# Altium footprint library Metric_Thru_Hole.PcbLib: 91 footprints (part 5 of 6)
Each footprint in its own frame and in the unit in brackets; x right, y up, seen from the top. Pads: shape width x height; smd on the part's side, far side on the other; paste and mask are expansions set on the pad; w line width, h text height; cw(c..) or ccw(c..) is an arc to the next point about the centre after c.
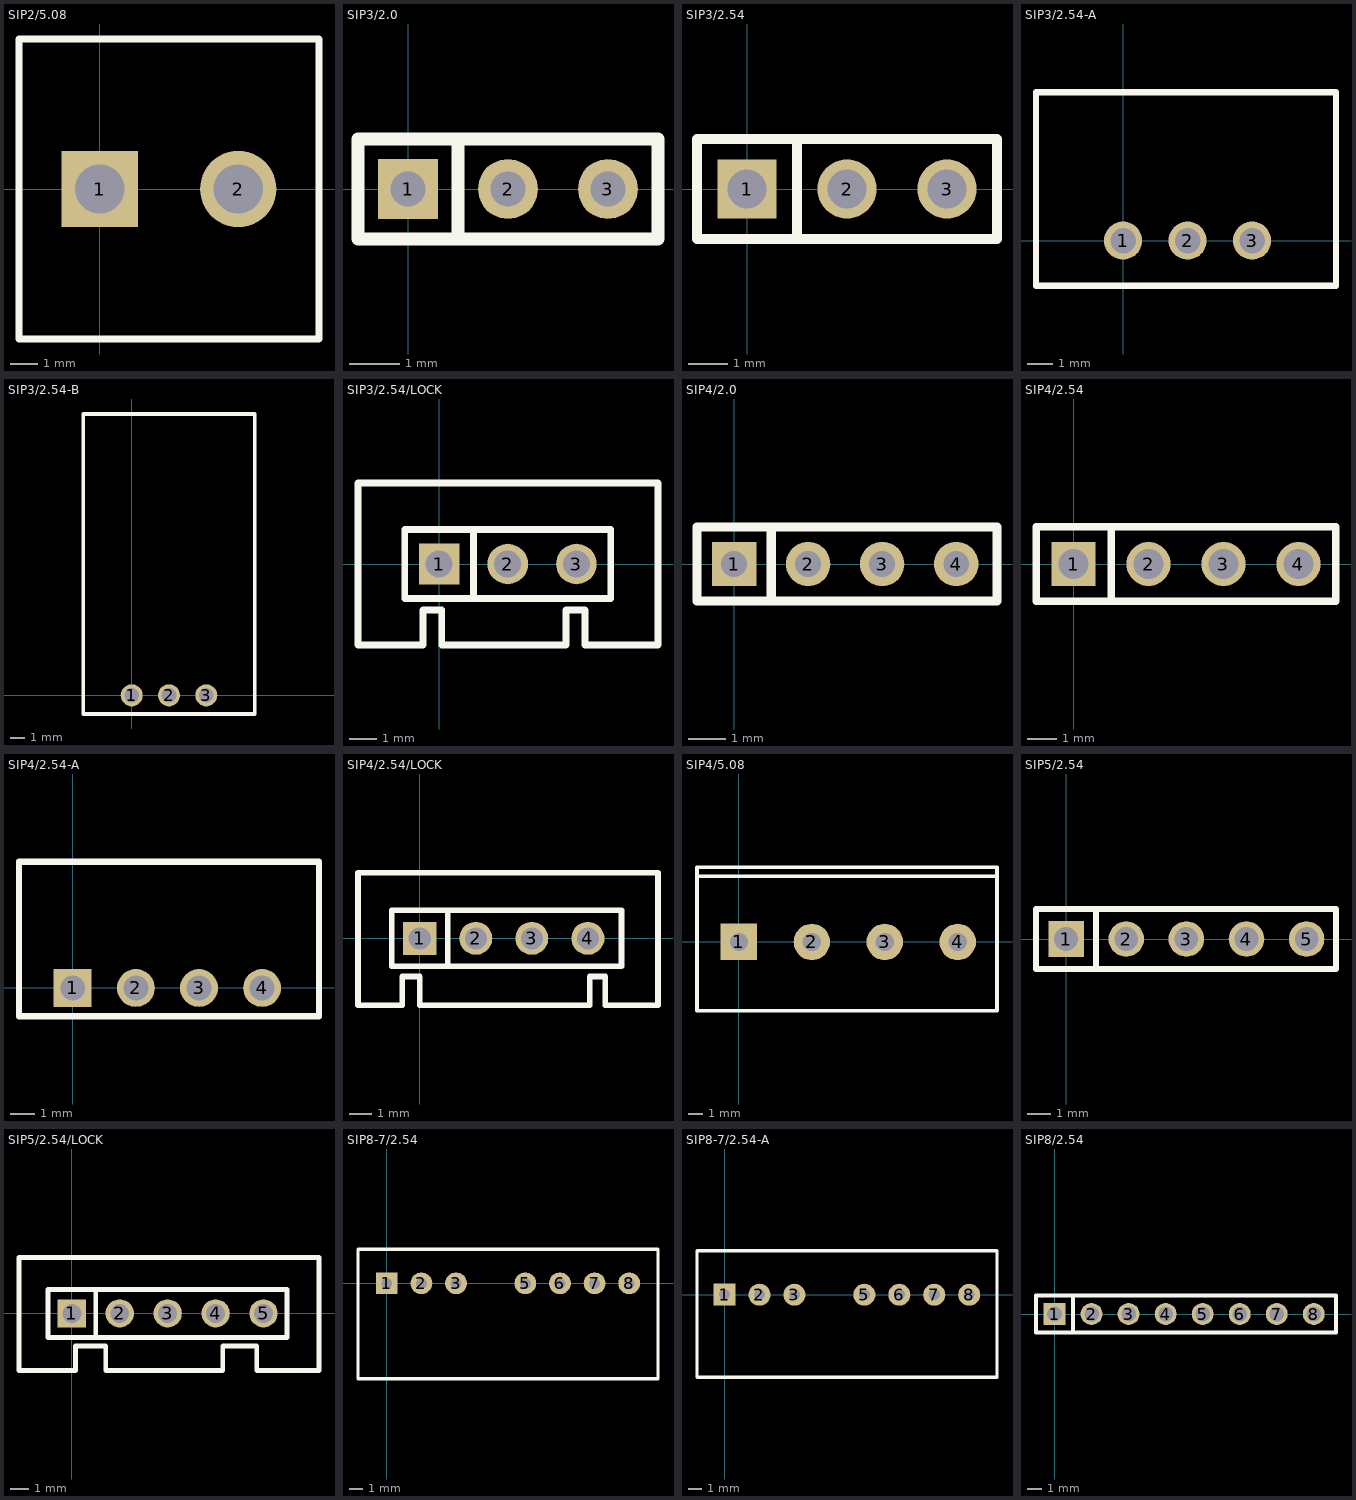
[diagram p4: the footprints below, top view; thin cyan lines are the x and y axes]

## SIP2/5.08 [mm]
pads (2):
  rect 2.8x2.8 hole 1.8: 1(0,0)
  round 2.8 hole 1.8: 2(5.08,0)
Top Overlay:
  lines w0.254: -2.96,-5.5 -2.96,5.5 8.04,5.5 8.04,-5.5 -2.96,-5.5

## SIP3/2.0 [mm] "3Leads,Pitch=2.0mm, 焊盘: 外径1.2mm,孔径0.7mm"
height 6.2
pads (3):
  rect 1.2x1.2 hole 0.7: 1(0,0)
  round 1.2 hole 0.7: 2(2,0) 3(4,0)
Top Overlay:
  lines w0.254: 1,-1 1,1 ; -1,-1 5,-1 5,1 -1,1 -1,0 -1,-1
3D body: height 5.59, standoff 0.51, extent 3.748,-0.253 4.254,0.253
3D body: height 5.59, standoff 0.51, extent 1.748,-0.253 2.254,0.253
3D body: height 5.59, standoff 0.51, extent -0.252,-0.253 0.254,0.253
3D body: height 1.02, standoff 0, extent 0.73,-1.27 3.26,1.265
3D body: height 1.02, standoff 0, extent 2.73,-1.27 5.26,1.265
3D body: height 1.02, standoff 0, extent -1.27,-1.27 1.26,1.265

## SIP3/2.54 [mm] "3 Leads,Pitch=2.54mm, 焊盘: 外径1.5mm,孔径1mm"
height 9
pads (3):
  rect 1.5x1.5 hole 1: 1(0,0)
  round 1.5 hole 1: 2(2.54,0) 3(5.08,0)
Top Overlay:
  lines w0.254: 1.27,-1.27 1.27,1.27 ; -1.27,-1.27 6.35,-1.27 6.35,1.27 -1.27,1.27 -1.27,-1.27
3D body "SW3dPS-0_1inch pin strip.STEP": height 1.05, standoff -10.55, extent -1.28,-1.27 6.34,1.27
3D body: height 5.59, standoff 0.51, extent 4.828,-0.253 5.334,0.253
3D body: height 5.59, standoff 0.51, extent 2.288,-0.253 2.794,0.253
3D body: height 5.59, standoff 0.51, extent -0.252,-0.253 0.254,0.253

## SIP3/2.54-A [mm] "11.6*7.55*10.16mm"
height 10.16
pads (3):
  round 1.5 hole 1: 1(0,0) 2(2.54,0) 3(5.08,0)
Top Overlay:
  lines w0.254: -3.429,-1.778 -3.429,5.842 8.382,5.842 8.382,-1.778 -3.429,-1.778
3D body: height 10.16, standoff 0, extent -3.429,-1.778 8.382,5.842

## SIP3/2.54-B [mm] "19*11.5*9mm"
height 9
pads (3):
  round 1.5 hole 1: 1(0,0) 2(2.54,0) 3(5.08,0)
Top Overlay:
  lines w0.254: -3.302,-1.27 8.382,-1.27 8.382,19.177 -3.302,19.177 -3.302,-1.27
3D body: height 9, standoff 0, extent -3.302,-1.27 8.382,19.177

## SIP3/2.54/LOCK [mm] "带锁单排2.54插针, 焊盘: 外径1.5mm,孔径1mm"
height 10
pads (3):
  rect 1.5x1.5 hole 1: 1(0,0)
  round 1.5 hole 1: 2(2.54,0) 3(5.08,0)
Top Overlay:
  lines w0.254: -3,-0.4 -3,0 ; 1.27,-1.27 1.27,1.27 ; 8.1,-0.2 8.1,0 ; -3,-3 -0.6,-3 -0.6,-1.7 0.1,-1.7 0.1,-3 4.7,-3 4.7,-1.7 5.4,-1.7 5.4,-3 8.1,-3 8.1,3 -3,3 -3,-3 ; -1.27,-1.27 6.35,-1.27 6.35,1.27 -1.27,1.27 -1.27,-1.27
3D body: height 5.08, standoff 0.25, extent -3.048,-3.048 0.762,-2.794
3D body: height 5.08, standoff 0.25, extent 4.064,-3.048 8.128,-2.794
3D body: height 5.08, standoff 0.25, extent -3.048,-3.048 -2.794,3.048
3D body: height 5.08, standoff 0.25, extent 7.874,-3.048 8.128,3.048
3D body: height 5.08, standoff 0.25, extent -3.048,2.794 8.128,3.048
3D body: height 5.59, standoff 0.51, extent -0.252,-0.253 0.254,0.253
3D body: height 1.02, standoff 0, extent -1.27,-1.27 1.26,1.265
3D body: height 5.59, standoff 0.51, extent 2.288,-0.253 2.794,0.253
3D body: height 1.02, standoff 0, extent 1.27,-1.27 3.8,1.265
3D body: height 5.59, standoff 0.51, extent 4.828,-0.253 5.334,0.253
3D body: height 1.02, standoff 0, extent 3.81,-1.27 6.34,1.265

## SIP4/2.0 [mm] "4 Leads,Pitch=2.0mm, 焊盘: 外径1.2mm,孔径0.7mm"
height 6.2
pads (4):
  rect 1.2x1.2 hole 0.7: 1(0,0)
  round 1.2 hole 0.7: 2(2,0) 3(4,0) 4(6,0)
Top Overlay:
  lines w0.254: 1,-1 1,1 ; -1,-1 7.1,-1 7.1,1 -1,1 -1,0 -1,-1
3D body: height 5.59, standoff 0.51, extent -0.252,-0.253 0.254,0.253
3D body: height 1.02, standoff 0, extent -1.27,-1.27 1.26,1.265
3D body: height 5.59, standoff 0.51, extent 1.748,-0.253 2.254,0.253
3D body: height 1.02, standoff 0, extent 0.73,-1.27 3.26,1.265
3D body: height 5.59, standoff 0.51, extent 3.748,-0.253 4.254,0.253
3D body: height 1.02, standoff 0, extent 2.73,-1.27 5.26,1.265
3D body: height 5.59, standoff 0.51, extent 5.748,-0.253 6.254,0.253
3D body: height 1.02, standoff 0, extent 4.73,-1.27 7.26,1.265

## SIP4/2.54 [mm] "不带锁单排2.54插针, 焊盘: 外径1.5mm,孔径1mm"
height 10
pads (4):
  rect 1.5x1.5 hole 1: 1(0,0)
  round 1.5 hole 1: 2(2.54,0) 3(5.08,0) 4(7.62,0)
Top Overlay:
  lines w0.254: 1.27,-1.27 1.27,1.27 ; -1.27,-1.27 8.89,-1.27 8.89,1.27 -1.27,1.27 -1.27,-1.27
3D body: height 1.02, standoff 0, extent 6.35,-1.27 8.88,1.265
3D body: height 5.59, standoff 0.51, extent 7.368,-0.253 7.874,0.253
3D body: height 1.02, standoff 0, extent 3.81,-1.27 6.34,1.265
3D body: height 5.59, standoff 0.51, extent 4.828,-0.253 5.334,0.253
3D body: height 1.02, standoff 0, extent 1.27,-1.27 3.8,1.265
3D body: height 5.59, standoff 0.51, extent 2.288,-0.253 2.794,0.253
3D body: height 1.02, standoff 0, extent -1.27,-1.27 1.26,1.265
3D body: height 5.59, standoff 0.51, extent -0.252,-0.253 0.254,0.253

## SIP4/2.54-A [mil]
height 393.7
pads (4):
  rect 60x60 hole 39.37: 1(0,0)
  round 60 hole 39.37: 2(100,0) 3(200,0) 4(300,0)
Top Overlay:
  lines w10: -85,-45 -85,200 390,200 390,-45 -85,-45
3D body: height 393.7, standoff 3.94, extent -85,-45 385,195

## SIP4/2.54/LOCK [mm] "带锁单排2.54插针, 焊盘: 外径1.5mm,孔径1mm"
height 10
pads (4):
  rect 1.5x1.5 hole 1: 1(0,0)
  round 1.5 hole 1: 2(2.54,0) 3(5.08,0) 4(7.62,0)
Top Overlay:
  lines w0.254: 1.27,-1.27 1.27,1.27 ; -2.8,-3.03 -2.8,2.97 0,2.97 7.7,2.97 10.8,2.97 10.8,-3.03 9.1,-3.03 8.4,-3.03 8.4,-1.73 7.7,-1.73 7.7,-3.03 0,-3.03 0,-1.73 -0.8,-1.73 -0.8,-3.03 -1.2,-3.03 -2.8,-3.03 ; -1.27,-1.27 9.144,-1.27 9.144,1.27 -1.27,1.27 -1.27,-1.27
3D body: height 5.08, standoff 0.25, extent -2.794,2.794 10.922,3.048
3D body: height 5.08, standoff 0.25, extent 10.668,-3.048 10.922,3.048
3D body: height 5.08, standoff 0.25, extent -2.794,-3.048 -2.54,3.048
3D body: height 5.08, standoff 0.25, extent 5.588,-3.048 10.922,-2.794
3D body: height 5.08, standoff 0.25, extent -2.794,-3.048 2.286,-2.794
3D body: height 5.59, standoff 0.51, extent -0.252,-0.253 0.254,0.253
3D body: height 1.02, standoff 0, extent -1.27,-1.27 1.26,1.265
3D body: height 5.59, standoff 0.51, extent 2.288,-0.253 2.794,0.253
3D body: height 1.02, standoff 0, extent 1.27,-1.27 3.8,1.265
3D body: height 5.59, standoff 0.51, extent 4.828,-0.253 5.334,0.253
3D body: height 1.02, standoff 0, extent 3.81,-1.27 6.34,1.265
3D body: height 5.59, standoff 0.51, extent 7.368,-0.253 7.874,0.253
3D body: height 1.02, standoff 0, extent 6.35,-1.27 8.88,1.265

## SIP4/5.08 [mm] "4PIN,5.08MM间距"
pads (4):
  rect 2.54x2.54 hole 1.27: 1(0,0)
  round 2.54 hole 1.27: 2(5.08,0) 3(10.16,0) 4(15.24,0)
Top Overlay:
  lines w0.254: -2.921,4.572 17.979,4.572 ; -2.921,-4.793 -2.921,5.207 17.979,5.207 17.979,-4.793 -2.921,-4.793
3D body "1711725.stp": height 18.3, standoff -5, extent -2.952,-5.461 7.778,5.739
3D body "1711725.stp": height 18.3, standoff -5, extent 7.208,-5.461 17.938,5.739

## SIP5/2.54 [mm] "单排2.54插针, 焊盘: 外径1.5mm,孔径1mm"
height 10
pads (5):
  rect 1.5x1.5 hole 1: 1(0,0)
  round 1.5 hole 1: 2(2.54,0) 3(5.08,0) 4(7.62,0) 5(10.16,0)
Top Overlay:
  lines w0.254: 1.27,-1.27 1.27,1.27 ; -1.27,-1.27 11.4,-1.27 11.4,1.27 -1.27,1.27 -1.27,-1.27
3D body: height 5.59, standoff 0.51, extent -0.252,-0.253 0.254,0.253
3D body: height 1.02, standoff 0, extent -1.27,-1.27 1.26,1.265
3D body: height 5.59, standoff 0.51, extent 2.288,-0.253 2.794,0.253
3D body: height 1.02, standoff 0, extent 1.27,-1.27 3.8,1.265
3D body: height 5.59, standoff 0.51, extent 4.828,-0.253 5.334,0.253
3D body: height 1.02, standoff 0, extent 3.81,-1.27 6.34,1.265
3D body: height 5.59, standoff 0.51, extent 7.368,-0.253 7.874,0.253
3D body: height 1.02, standoff 0, extent 6.35,-1.27 8.88,1.265
3D body: height 5.59, standoff 0.51, extent 9.908,-0.253 10.414,0.253
3D body: height 1.02, standoff 0, extent 8.89,-1.27 11.42,1.265

## SIP5/2.54/LOCK [mm] "带锁单排2.54插针, 焊盘: 外径1.5mm,孔径1mm"
height 10
pads (5):
  rect 1.5x1.5 hole 1: 1(0,0)
  round 1.5 hole 1: 2(2.54,0) 3(5.08,0) 4(7.62,0) 5(10.16,0)
Top Overlay:
  lines w0.254: 1.27,-1.27 1.27,1.27 ; -2.8,-3.03 -2.8,2.97 0,2.97 7.7,2.97 13.1,2.97 13.1,-3.03 9.8,-3.03 9.8,-1.73 8,-1.73 8,-3.03 1.8,-3.03 1.8,-1.73 0.2,-1.73 0.2,-3.03 -1.2,-3.03 -2.8,-3.03 ; -1.27,-1.27 11.4,-1.27 11.4,1.27 -1.27,1.27 -1.27,-1.27
3D body: height 5.08, standoff 0.25, extent -2.794,-3.048 3.048,-2.794
3D body: height 5.08, standoff 0.25, extent 6.858,-3.048 13.208,-2.794
3D body: height 5.08, standoff 0.25, extent -2.794,-3.048 -2.54,3.048
3D body: height 5.08, standoff 0.25, extent 12.954,-3.048 13.208,3.048
3D body: height 5.08, standoff 0.25, extent -2.794,2.794 13.208,3.048
3D body: height 5.59, standoff 0.51, extent -0.252,-0.253 0.254,0.253
3D body: height 1.02, standoff 0, extent -1.27,-1.27 1.26,1.265
3D body: height 5.59, standoff 0.51, extent 2.288,-0.253 2.794,0.253
3D body: height 1.02, standoff 0, extent 1.27,-1.27 3.8,1.265
3D body: height 5.59, standoff 0.51, extent 4.828,-0.253 5.334,0.253
3D body: height 1.02, standoff 0, extent 3.81,-1.27 6.34,1.265
3D body: height 5.59, standoff 0.51, extent 7.368,-0.253 7.874,0.253
3D body: height 1.02, standoff 0, extent 6.35,-1.27 8.88,1.265
3D body: height 5.59, standoff 0.51, extent 9.908,-0.253 10.414,0.253
3D body: height 1.02, standoff 0, extent 8.89,-1.27 11.42,1.265

## SIP8-7/2.54 [mm] "SIP封装,8Pin,22mm*9.5mm*12mm,可兼容SIP8-7/2.54-A"
height 12
pads (7):
  rect 1.6x1.6 hole 0.8: 1(0,0)
  round 1.6 hole 0.8: 2(2.54,0) 3(5.08,0) 5(10.16,0) 6(12.7,0) 7(15.24,0) 8(17.78,0)
Top Overlay:
  lines w0.254: -2.11,-7 19.89,-7 19.89,2.5 -2.11,2.5 -2.11,-7
3D body: height 12, standoff 0, extent -2.11,-7 19.89,2.5

## SIP8-7/2.54-A [mm] "SIP封装,8Pin,21.8mm*91.mm*11.2mm"
height 11.2
pads (7):
  rect 1.6x1.6 hole 0.8: 1(0,0)
  round 1.6 hole 0.8: 2(2.54,0) 3(5.08,0) 5(10.16,0) 6(12.7,0) 7(15.24,0) 8(17.78,0)
Top Overlay:
  lines w0.254: -2,-6 19.795,-6 19.8,-5.995 19.8,3.2 -2,3.2 -2,-6
3D body: height 11.2, standoff 0, extent -2.11,-6 19.89,3.2

## SIP8/2.54 [mm] "不带锁单排2.54插针, 焊盘: 外径1.5mm,孔径1mm"
height 10
pads (8):
  rect 1.5x1.5 hole 1: 1(0,0)
  round 1.5 hole 1: 2(2.54,0) 3(5.08,0) 4(7.62,0) 5(10.16,0) 6(12.7,0) 7(15.24,0) 8(17.78,0)
Top Overlay:
  lines w0.254: 1.27,-1.27 1.27,1.27 ; -1.27,-1.27 -1.27,1.27 19.304,1.27 19.304,-1.27 -1.27,-1.27
3D body: height 1.02, standoff 0, extent 16.51,-1.27 19.04,1.265
3D body: height 5.59, standoff 0.51, extent 17.528,-0.253 18.034,0.253
3D body: height 1.02, standoff 0, extent 13.97,-1.27 16.5,1.265
3D body: height 5.59, standoff 0.51, extent 14.988,-0.253 15.494,0.253
3D body: height 1.02, standoff 0, extent 11.43,-1.27 13.96,1.265
3D body: height 5.59, standoff 0.51, extent 12.448,-0.253 12.954,0.253
3D body: height 1.02, standoff 0, extent 8.89,-1.27 11.42,1.265
3D body: height 5.59, standoff 0.51, extent 9.908,-0.253 10.414,0.253
3D body: height 5.59, standoff 0.51, extent -0.252,-0.253 0.254,0.253
3D body: height 1.02, standoff 0, extent -1.27,-1.27 1.26,1.265
3D body: height 5.59, standoff 0.51, extent 2.288,-0.253 2.794,0.253
3D body: height 1.02, standoff 0, extent 1.27,-1.27 3.8,1.265
3D body: height 5.59, standoff 0.51, extent 4.828,-0.253 5.334,0.253
3D body: height 1.02, standoff 0, extent 3.81,-1.27 6.34,1.265
3D body: height 5.59, standoff 0.51, extent 7.368,-0.253 7.874,0.253
3D body: height 1.02, standoff 0, extent 6.35,-1.27 8.88,1.265